# Altium footprint library 20210518.PcbLib: 414 footprints (part 15 of 26)
Each footprint in its own frame and in the unit in brackets; x right, y up, seen from the top. Pads: shape width x height; smd on the part's side, far side on the other; paste and mask are expansions set on the pad; w line width, h text height; cw(c..) or ccw(c..) is an arc to the next point about the centre after c.
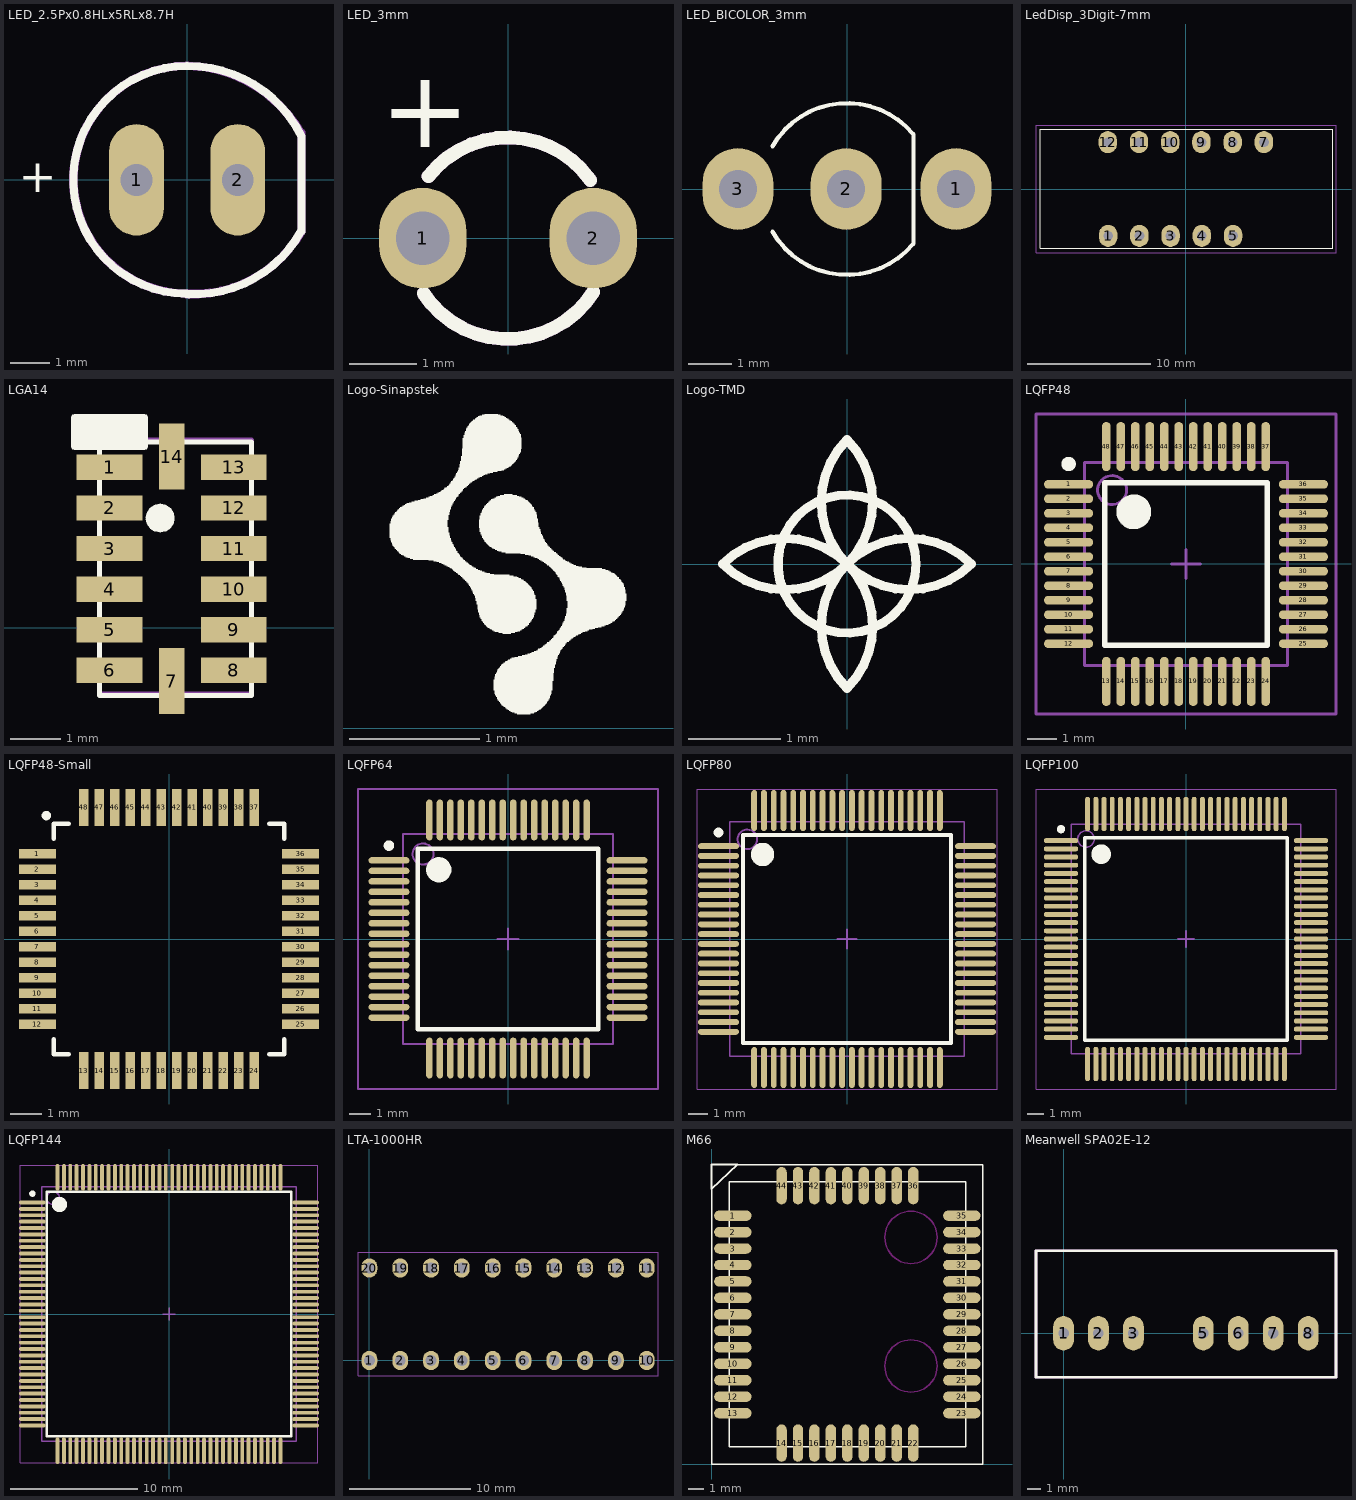
[diagram p14: the footprints below, top view; thin cyan lines are the x and y axes]

## LED_2.5Px0.8HLx5RLx8.7H [mil] "Radial, Round with Domed Top,  2 Position, 2.5mm pin space, 0.8mm hole, Body 5mm Radius, Height 8.7mm"
height 342.52
pads (2):
  oval 54x110 hole 31.5: 1(-50,0) 2(50,0)
Top Overlay:
  lines w7.99: 1.61,-113.03 ccw(c6.35,8.48) 112.6,-50.67
  lines w8: -0.49,-112.5 cw(c0,0) 0,112.5 cw(c0.5,-13.28) 112.99,43 113,-51.02
  text "+" at -166.06,-23.35 h56.25
Mechanical 13:
  lines w8: -112.5,0 cw(c0,0) 0,112.5 cw(c-2.2,-19.9) 113.01,45.39 113,-51 cw(c6.15,10.77) 0,-112.5 cw(c0,0) -112.5,0
Mechanical 15:
  lines w8: -0.59,-112.99 ccw(c5.56,10.27) 112.41,-51.49 ; -0.59,112.68 cw(c-2.79,-19.72) 112.41,45.56 ; 0.41,-112.22 cw(c0.41,0.28) -112.09,0.28 cw(c0.41,0.28) 0.41,112.78 ; 112.83,-49.77 112.83,46.61
3D body: height 346.72, standoff -235.72, extent -114.58,-118.12 98.81,118.87

## LED_3mm [mm]
height 8.7
pads (2):
  oval 1.3x1.5 hole 0.8: 1(-1.27,0) 2(1.27,0)
Top Overlay:
  lines w0.203: -1.256,-0.82 ccw(c0,0) 1.269,-0.8 ; -1.182,0.923 cw(c0,0) 1.225,0.865
  text "+" at -1.905,0.965 h2
Mechanical 13:
  lines w0.203: -1.256,-0.82 ccw(c0,0) 1.269,-0.8 ; -1.182,0.923 cw(c0,0) 1.225,0.865
Mechanical 15:
  lines w0.203: -1.256,-0.82 ccw(c0,0) 1.269,-0.8 ; -1.182,0.923 cw(c0,0) 1.225,0.865
3D body: height 5.5, standoff -3, extent -1.9,-1.9 1.6,1.9

## LED_BICOLOR_3mm [mil]
pads (3):
  oval 65x75 hole 35: 1(100,0) 2(-0.79,0) 3(-100,0)
Top Overlay:
  lines w3.94: -68.37,-39.07 ccw(c0,0) 60.49,-50.41 ; -68.37,39.07 cw(c0,0) 60.49,50.41 ; 61.02,-50.2 61.02,50.2
3D body: height 274.6, standoff -106.3, extent -107.88,-74.8 107.88,74.8

## LedDisp_3Digit-7mm [mm]
height 8.7
pads (11):
  oval 1.5x1.8 hole 0.8: 1(-6.32,-3.81) 2(-3.78,-3.81) 3(-1.24,-3.81) 4(1.3,-3.81) 5(3.84,-3.81) 7(6.35,3.81) 8(3.81,3.81) 9(1.27,3.81) 10(-1.27,3.81) 11(-3.81,3.81) 12(-6.35,3.81)
Top Overlay:
  lines w0.1: -11.862,-4.801 -11.862,4.851 11.938,4.851 11.938,-4.801 -11.862,-4.801
Mechanical 15:
  lines w0.1: -12.192,-5.207 12.217,-5.207 12.217,5.207 -12.192,5.207 -12.192,-5.207
3D body: height 5.81, standoff -3.5, extent -12,-5.01 12,5

## LGA14 [mm]
pads (14):
  rect 1.3x0.5 smd: 1(-5.004,3.164) 2(-5.004,2.364) 3(-5.004,1.564) 4(-5.004,0.764) 5(-5.004,-0.036) 6(-5.004,-0.836) 8(-2.554,-0.836) 9(-2.554,-0.036) 10(-2.554,0.764) 11(-2.554,1.564) 12(-2.554,2.364) 13(-2.554,3.164)
  rect 0.5x1.3 smd: 7(-3.779,-1.049) 14(-3.779,3.377)
Top Overlay:
  region: -3.907,2.428 -3.898,2.422 -3.888,2.42 -3.814,2.371 -3.808,2.362 -3.799,2.356 -3.75,2.282 -3.747,2.272 -3.741,2.263 -3.724,2.175 -3.726,2.165 -3.724,2.154 -3.741,2.067 -3.747,2.058 -3.75,2.048 -3.759,2.034 -3.76,2.033 -3.761,2.031 -3.799,1.974 -3.808,1.968 -3.814,1.959 -3.888,1.91 -3.898,1.907 -3.907,1.901 -3.994,1.884 -4.005,1.886 -4.015,1.884 -4.103,1.901 -4.112,1.907 -4.122,1.91 -4.196,1.959 -4.202,1.968 -4.211,1.974 -4.26,2.048 -4.262,2.058 -4.268,2.067 -4.286,2.154 -4.284,2.165 -4.286,2.175 -4.268,2.263 -4.262,2.272 -4.26,2.282 -4.211,2.356 -4.202,2.362 -4.196,2.371 -4.122,2.42 -4.112,2.422 -4.103,2.428 -4.015,2.446 -4.005,2.444 -3.994,2.446
  region: -4.266,4.201 -4.251,4.163 -4.251,3.564 -4.266,3.525 -4.305,3.51 -5.703,3.51 -5.742,3.525 -5.757,3.564 -5.757,4.163 -5.742,4.201 -5.703,4.217 -4.305,4.217
  lines w0.1: -5.204,-1.332 -5.204,3.664 -3.306,3.664 -2.207,3.664 -2.207,-1.332 -5.204,-1.332
Mechanical 13:
  lines w0.1: -5.2,3.7 -5.2,-1.3 -2.2,-1.3 -2.2,3.7 -5.1,3.7
Mechanical 15:
  lines w0.1: -5.2,-1.3 -2.2,-1.3 -2.2,3.7 -5.2,3.7 -5.2,-1.3
3D body: height 0, standoff -1.43, extent -5.3,-1.3 -2.3,3.7

## Logo-Sinapstek [mm]
Top Overlay:
  drawing of 2 lines, arcs and shapes, not listed

## Logo-TMD [mm]
Top Overlay:
  circle w0.1: c0,0 r0.75
  lines w0.1: 0,0 ccw(c0.675,0.675) 1.35,0 ccw(c0.675,-0.675) 0,0 ; 0,0 ccw(c0.675,-0.675) 0,-1.35 ccw(c-0.675,-0.675) 0,0 ; 0,0 ccw(c-0.675,-0.675) -1.35,0 ccw(c-0.675,0.675) 0,0 ; 0,0 cw(c0.675,0.675) 0,1.35 cw(c-0.675,0.675) 0,0

## LQFP48 [mm] "LQFP, 48-Leads, Body 9,1x9,1mm (max), Pitch 0,50mm, IPC Medium Density"
height 0.2
pads (48):
  oval 1.7x0.3 smd: 1(-4.05,2.75) 2(-4.05,2.25) 3(-4.05,1.75) 4(-4.05,1.25) 5(-4.05,0.75) 6(-4.05,0.25) 7(-4.05,-0.25) 8(-4.05,-0.75) 9(-4.05,-1.25) 10(-4.05,-1.75) 11(-4.05,-2.25) 12(-4.05,-2.75) 25(4.05,-2.75) 26(4.05,-2.25) 27(4.05,-1.75) 28(4.05,-1.25) 29(4.05,-0.75) 30(4.05,-0.25) 31(4.05,0.25) 32(4.05,0.75) 33(4.05,1.25) 34(4.05,1.75) 35(4.05,2.25) 36(4.05,2.75)
  oval 0.3x1.7 smd: 13(-2.75,-4.05) 14(-2.25,-4.05) 15(-1.75,-4.05) 16(-1.25,-4.05) 17(-0.75,-4.05) 18(-0.25,-4.05) 19(0.25,-4.05) 20(0.75,-4.05) 21(1.25,-4.05) 22(1.75,-4.05) 23(2.25,-4.05) 24(2.75,-4.05) 37(2.75,4.05) 38(2.25,4.05) 39(1.75,4.05) 40(1.25,4.05) 41(0.75,4.05) 42(0.25,4.05) 43(-0.25,4.05) 44(-0.75,4.05) 45(-1.25,4.05) 46(-1.75,4.05) 47(-2.25,4.05) 48(-2.75,4.05)
Top Overlay:
  circle w0.25: c-4.05,3.45 r0.125
  circle w0.6: c-1.8,1.8 r0.3
  lines w0.2: -2.8,-2.8 -2.8,2.8 2.8,2.8 2.8,-2.8 -2.8,-2.8
Mechanical 13:
  circle w0.1: c-2.55,2.55 r0.5
  lines w0.1: -3.5,-3.5 -3.5,3.5 3.5,3.5 3.5,-3.5 -3.5,-3.5
Mechanical 15:
  lines w0.1: -0.5,0 0.5,0 ; 0,-0.5 0,0.5 ; -5.175,-5.175 -5.175,5.175 5.175,5.175 5.175,-5.175 -5.175,-5.175
3D body: height 1.45, standoff 0, extent -4.5,-4.5 4.5,4.5

## LQFP48-Small [mm]
pads (48):
  rect 1.194x0.305 smd: 1(-4.25,2.75) 2(-4.25,2.25) 3(-4.25,1.75) 4(-4.25,1.25) 5(-4.25,0.75) 6(-4.25,0.25) 7(-4.25,-0.25) 8(-4.25,-0.75) 9(-4.25,-1.25) 10(-4.25,-1.75) 11(-4.25,-2.25) 12(-4.25,-2.75) 25(4.25,-2.75) 26(4.25,-2.25) 27(4.25,-1.75) 28(4.25,-1.25) 29(4.25,-0.75) 30(4.25,-0.25) 31(4.25,0.25) 32(4.25,0.75) 33(4.25,1.25) 34(4.25,1.75) 35(4.25,2.25) 36(4.25,2.75)
  rect 0.305x1.194 smd: 13(-2.75,-4.25) 14(-2.25,-4.25) 15(-1.75,-4.25) 16(-1.25,-4.25) 17(-0.75,-4.25) 18(-0.25,-4.25) 19(0.25,-4.25) 20(0.75,-4.25) 21(1.25,-4.25) 22(1.75,-4.25) 23(2.25,-4.25) 24(2.75,-4.25) 37(2.75,4.25) 38(2.25,4.25) 39(1.75,4.25) 40(1.25,4.25) 41(0.75,4.25) 42(0.25,4.25) 43(-0.25,4.25) 44(-0.75,4.25) 45(-1.25,4.25) 46(-1.75,4.25) 47(-2.25,4.25) 48(-2.75,4.25)
Top Overlay:
  circle w0.152: c-3.962,3.988 r0.076
  lines w0.152: -3.721,-3.235 -3.721,-3.721 -3.235,-3.721 ; -3.721,3.235 -3.721,3.721 -3.235,3.721 ; 3.235,-3.721 3.721,-3.721 3.721,-3.235 ; 3.235,3.721 3.721,3.721 3.721,3.235
3D body: height 1.6, standoff 0, extent -4.498,-4.497 4.496,4.497

## LQFP64 [mm] "LQFP, 64-Leads, Body 12,2x12,2mm (max), Pitch 0,50mm, IPC Low Density"
height 1.7
pads (64):
  oval 1.95x0.3 smd: 1(-5.675,3.75) 2(-5.675,3.25) 3(-5.675,2.75) 4(-5.675,2.25) 5(-5.675,1.75) 6(-5.675,1.25) 7(-5.675,0.75) 8(-5.675,0.25) 9(-5.675,-0.25) 10(-5.675,-0.75) 11(-5.675,-1.25) 12(-5.675,-1.75) 13(-5.675,-2.25) 14(-5.675,-2.75) 15(-5.675,-3.25) 16(-5.675,-3.75) 33(5.675,-3.75) 34(5.675,-3.25) 35(5.675,-2.75) 36(5.675,-2.25) 37(5.675,-1.75) 38(5.675,-1.25) 39(5.675,-0.75) 40(5.675,-0.25) 41(5.675,0.25) 42(5.675,0.75) 43(5.675,1.25) 44(5.675,1.75) 45(5.675,2.25) 46(5.675,2.75) 47(5.675,3.25) 48(5.675,3.75)
  oval 0.3x1.95 smd: 17(-3.75,-5.675) 18(-3.25,-5.675) 19(-2.75,-5.675) 20(-2.25,-5.675) 21(-1.75,-5.675) 22(-1.25,-5.675) 23(-0.75,-5.675) 24(-0.25,-5.675) 25(0.25,-5.675) 26(0.75,-5.675) 27(1.25,-5.675) 28(1.75,-5.675) 29(2.25,-5.675) 30(2.75,-5.675) 31(3.25,-5.675) 32(3.75,-5.675) 49(3.75,5.675) 50(3.25,5.675) 51(2.75,5.675) 52(2.25,5.675) 53(1.75,5.675) 54(1.25,5.675) 55(0.75,5.675) 56(0.25,5.675) 57(-0.25,5.675) 58(-0.75,5.675) 59(-1.25,5.675) 60(-1.75,5.675) 61(-2.25,5.675) 62(-2.75,5.675) 63(-3.25,5.675) 64(-3.75,5.675)
Top Overlay:
  circle w0.25: c-5.675,4.45 r0.125
  circle w0.6: c-3.3,3.3 r0.3
  lines w0.2: -4.3,-4.3 -4.3,4.3 4.3,4.3 4.3,-4.3 -4.3,-4.3
Mechanical 13:
  circle w0.1: c-4.05,4.05 r0.5
  lines w0.1: -5,-5 -5,5 5,5 5,-5 -5,-5
Mechanical 15:
  lines w0.1: -0.5,0 0.5,0 ; 0,-0.5 0,0.5 ; -7.15,-7.15 -7.15,7.15 7.15,7.15 7.15,-7.15 -7.15,-7.15
3D body: height 1.6, standoff 0, extent -6,-6 6,6

## LQFP80 [mm] "LQFP, 80-Leads, Body 12,00x12,00mm, Pitch 0,50mm, IPC Medium Density"
height 1.6
pads (80):
  oval 2.1x0.3 smd: 1(-6.575,4.75) 2(-6.575,4.25) 3(-6.575,3.75) 4(-6.575,3.25) 5(-6.575,2.75) 6(-6.575,2.25) 7(-6.575,1.75) 8(-6.575,1.25) 9(-6.575,0.75) 10(-6.575,0.25) 11(-6.575,-0.25) 12(-6.575,-0.75) 13(-6.575,-1.25) 14(-6.575,-1.75) 15(-6.575,-2.25) 16(-6.575,-2.75) 17(-6.575,-3.25) 18(-6.575,-3.75) 19(-6.575,-4.25) 20(-6.575,-4.75) 41(6.575,-4.75) 42(6.575,-4.25) 43(6.575,-3.75) 44(6.575,-3.25) 45(6.575,-2.75) 46(6.575,-2.25) 47(6.575,-1.75) 48(6.575,-1.25) 49(6.575,-0.75) 50(6.575,-0.25) 51(6.575,0.25) 52(6.575,0.75) 53(6.575,1.25) 54(6.575,1.75) 55(6.575,2.25) 56(6.575,2.75) 57(6.575,3.25) 58(6.575,3.75) 59(6.575,4.25) 60(6.575,4.75)
  oval 0.3x2.1 smd: 21(-4.75,-6.575) 22(-4.25,-6.575) 23(-3.75,-6.575) 24(-3.25,-6.575) 25(-2.75,-6.575) 26(-2.25,-6.575) 27(-1.75,-6.575) 28(-1.25,-6.575) 29(-0.75,-6.575) 30(-0.25,-6.575) 31(0.25,-6.575) 32(0.75,-6.575) 33(1.25,-6.575) 34(1.75,-6.575) 35(2.25,-6.575) 36(2.75,-6.575) 37(3.25,-6.575) 38(3.75,-6.575) 39(4.25,-6.575) 40(4.75,-6.575) 61(4.75,6.575) 62(4.25,6.575) 63(3.75,6.575) 64(3.25,6.575) 65(2.75,6.575) 66(2.25,6.575) 67(1.75,6.575) 68(1.25,6.575) 69(0.75,6.575) 70(0.25,6.575) 71(-0.25,6.575) 72(-0.75,6.575) 73(-1.25,6.575) 74(-1.75,6.575) 75(-2.25,6.575) 76(-2.75,6.575) 77(-3.25,6.575) 78(-3.75,6.575) 79(-4.25,6.575) 80(-4.75,6.575)
Top Overlay:
  circle w0.6: c-4.325,4.325 r0.3
  circle w0.25: c-6.575,5.45 r0.125
  lines w0.2: -5.325,-5.325 5.325,-5.325 5.325,5.325 -5.325,5.325 -5.325,-5.325
Mechanical 13:
  circle w0.1: c-5.1,5.1 r0.5
  lines w0.1: -6,-6 6,-6 6,6 -6,6 -6,-6
Mechanical 15:
  lines w0.05: -7.675,-7.675 7.675,-7.675 7.675,7.675 -7.675,7.675 -7.675,-7.675
  lines w0.1: -0.5,0 0.5,0 ; 0,-0.5 0,0.5
3D body: height 1.62, standoff -0.01, extent -7.072,-7.072 7.072,7.072

## LQFP100 [mm] "LQFP, 100-Leads, Body 14,00x14,00mm, Pitch 0,50mm, IPC Low Density"
height 1.6
pads (100):
  oval 2.1x0.3 smd: 1(-7.625,6) 2(-7.625,5.5) 3(-7.625,5) 4(-7.625,4.5) 5(-7.625,4) 6(-7.625,3.5) 7(-7.625,3) 8(-7.625,2.5) 9(-7.625,2) 10(-7.625,1.5) 11(-7.625,1) 12(-7.625,0.5) 13(-7.625,0) 14(-7.625,-0.5) 15(-7.625,-1) 16(-7.625,-1.5) 17(-7.625,-2) 18(-7.625,-2.5) 19(-7.625,-3) 20(-7.625,-3.5) 21(-7.625,-4) 22(-7.625,-4.5) 23(-7.625,-5) 24(-7.625,-5.5) 25(-7.625,-6) 51(7.625,-6) 52(7.625,-5.5) 53(7.625,-5) 54(7.625,-4.5) 55(7.625,-4) 56(7.625,-3.5) 57(7.625,-3) 58(7.625,-2.5) 59(7.625,-2) 60(7.625,-1.5) 61(7.625,-1) 62(7.625,-0.5) 63(7.625,0) 64(7.625,0.5) 65(7.625,1) 66(7.625,1.5) 67(7.625,2) 68(7.625,2.5) 69(7.625,3) 70(7.625,3.5) 71(7.625,4) 72(7.625,4.5) 73(7.625,5) 74(7.625,5.5) 75(7.625,6)
  oval 0.3x2.1 smd: 26(-6,-7.625) 27(-5.5,-7.625) 28(-5,-7.625) 29(-4.5,-7.625) 30(-4,-7.625) 31(-3.5,-7.625) 32(-3,-7.625) 33(-2.5,-7.625) 34(-2,-7.625) 35(-1.5,-7.625) 36(-1,-7.625) 37(-0.5,-7.625) 38(0,-7.625) 39(0.5,-7.625) 40(1,-7.625) 41(1.5,-7.625) 42(2,-7.625) 43(2.5,-7.625) 44(3,-7.625) 45(3.5,-7.625) 46(4,-7.625) 47(4.5,-7.625) 48(5,-7.625) 49(5.5,-7.625) 50(6,-7.625) 76(6,7.625) 77(5.5,7.625) 78(5,7.625) 79(4.5,7.625) 80(4,7.625) 81(3.5,7.625) 82(3,7.625) 83(2.5,7.625) 84(2,7.625) 85(1.5,7.625) 86(1,7.625) 87(0.5,7.625) 88(0,7.625) 89(-0.5,7.625) 90(-1,7.625) 91(-1.5,7.625) 92(-2,7.625) 93(-2.5,7.625) 94(-3,7.625) 95(-3.5,7.625) 96(-4,7.625) 97(-4.5,7.625) 98(-5,7.625) 99(-5.5,7.625) 100(-6,7.625)
Top Overlay:
  circle w0.6: c-5.175,5.175 r0.3
  circle w0.25: c-7.625,6.7 r0.125
  lines w0.2: -6.175,-6.175 6.175,-6.175 6.175,6.175 -6.175,6.175 -6.175,-6.175
Mechanical 13:
  circle w0.1: c-6.1,6.1 r0.5
  lines w0.1: -7,-7 7,-7 7,7 -7,7 -7,-7
Mechanical 15:
  lines w0.05: -9.15,-9.15 9.15,-9.15 9.15,9.15 -9.15,9.15 -9.15,-9.15
  lines w0.1: -0.5,0 0.5,0 ; 0,-0.5 0,0.5
3D body: height 1.6, standoff 0, extent -8,-8 8,8

## LQFP144 [mm] "TSQFP, 144-Leads, Body 20,00x20,00mm, Pitch 0,50mm, IPC Medium Density"
height 1.6
pads (144):
  oval 2.1x0.3 smd: 1(-10.725,8.75) 2(-10.725,8.25) 3(-10.725,7.75) 4(-10.725,7.25) 5(-10.725,6.75) 6(-10.725,6.25) 7(-10.725,5.75) 8(-10.725,5.25) 9(-10.725,4.75) 10(-10.725,4.25) 11(-10.725,3.75) 12(-10.725,3.25) 13(-10.725,2.75) 14(-10.725,2.25) 15(-10.725,1.75) 16(-10.725,1.25) 17(-10.725,0.75) 18(-10.725,0.25) 19(-10.725,-0.25) 20(-10.725,-0.75) 21(-10.725,-1.25) 22(-10.725,-1.75) 23(-10.725,-2.25) 24(-10.725,-2.75) 25(-10.725,-3.25) 26(-10.725,-3.75) 27(-10.725,-4.25) 28(-10.725,-4.75) 29(-10.725,-5.25) 30(-10.725,-5.75) 31(-10.725,-6.25) 32(-10.725,-6.75) 33(-10.725,-7.25) 34(-10.725,-7.75) 35(-10.725,-8.25) 36(-10.725,-8.75) 73(10.725,-8.75) 74(10.725,-8.25) 75(10.725,-7.75) 76(10.725,-7.25) 77(10.725,-6.75) 78(10.725,-6.25) 79(10.725,-5.75) 80(10.725,-5.25) 81(10.725,-4.75) 82(10.725,-4.25) 83(10.725,-3.75) 84(10.725,-3.25) 85(10.725,-2.75) 86(10.725,-2.25) 87(10.725,-1.75) 88(10.725,-1.25) 89(10.725,-0.75) 90(10.725,-0.25) 91(10.725,0.25) 92(10.725,0.75) 93(10.725,1.25) 94(10.725,1.75) 95(10.725,2.25) 96(10.725,2.75) 97(10.725,3.25) 98(10.725,3.75) 99(10.725,4.25) 100(10.725,4.75) 101(10.725,5.25) 102(10.725,5.75) 103(10.725,6.25) 104(10.725,6.75) 105(10.725,7.25) 106(10.725,7.75) 107(10.725,8.25) 108(10.725,8.75)
  oval 0.3x2.1 smd: 37(-8.75,-10.725) 38(-8.25,-10.725) 39(-7.75,-10.725) 40(-7.25,-10.725) 41(-6.75,-10.725) 42(-6.25,-10.725) 43(-5.75,-10.725) 44(-5.25,-10.725) 45(-4.75,-10.725) 46(-4.25,-10.725) 47(-3.75,-10.725) 48(-3.25,-10.725) 49(-2.75,-10.725) 50(-2.25,-10.725) 51(-1.75,-10.725) 52(-1.25,-10.725) 53(-0.75,-10.725) 54(-0.25,-10.725) 55(0.25,-10.725) 56(0.75,-10.725) 57(1.25,-10.725) 58(1.75,-10.725) 59(2.25,-10.725) 60(2.75,-10.725) 61(3.25,-10.725) 62(3.75,-10.725) 63(4.25,-10.725) 64(4.75,-10.725) 65(5.25,-10.725) 66(5.75,-10.725) 67(6.25,-10.725) 68(6.75,-10.725) 69(7.25,-10.725) 70(7.75,-10.725) 71(8.25,-10.725) 72(8.75,-10.725) 109(8.75,10.725) 110(8.25,10.725) 111(7.75,10.725) 112(7.25,10.725) 113(6.75,10.725) 114(6.25,10.725) 115(5.75,10.725) 116(5.25,10.725) 117(4.75,10.725) 118(4.25,10.725) 119(3.75,10.725) 120(3.25,10.725) 121(2.75,10.725) 122(2.25,10.725) 123(1.75,10.725) 124(1.25,10.725) 125(0.75,10.725) 126(0.25,10.725) 127(-0.25,10.725) 128(-0.75,10.725) 129(-1.25,10.725) 130(-1.75,10.725) 131(-2.25,10.725) 132(-2.75,10.725) 133(-3.25,10.725) 134(-3.75,10.725) 135(-4.25,10.725) 136(-4.75,10.725) 137(-5.25,10.725) 138(-5.75,10.725) 139(-6.25,10.725) 140(-6.75,10.725) 141(-7.25,10.725) 142(-7.75,10.725) 143(-8.25,10.725) 144(-8.75,10.725)
Top Overlay:
  circle w0.6: c-8.6,8.6 r0.3
  circle w0.25: c-10.725,9.45 r0.125
  lines w0.2: -9.6,-9.6 9.6,-9.6 9.6,9.6 -9.6,9.6 -9.6,-9.6
Mechanical 13:
  circle w0.1: c-9.1,9.1 r0.5
  lines w0.1: -10,-10 10,-10 10,10 -10,10 -10,-10
Mechanical 15:
  lines w0.05: -11.675,-11.675 11.675,-11.675 11.675,11.675 -11.675,11.675 -11.675,-11.675
  lines w0.1: -0.5,0 0.5,0 ; 0,-0.5 0,0.5
3D body: height 1.6, standoff 0, extent -11.075,-11.075 11.075,11.075

## LTA-1000HR [mm] "10 Wide, DIP Red (x 10) Tinted"
height 8
pads (20):
  oval 1.3x1.6 hole 0.9: 1(0,0) 2(2.54,0) 3(5.08,0) 4(7.62,0) 5(10.16,0) 6(12.7,0) 7(15.24,0) 8(17.78,0) 9(20.32,0) 10(22.86,0) 11(22.86,7.62) 12(20.32,7.62) 13(17.78,7.62) 14(15.24,7.62) 15(12.7,7.62) 16(10.16,7.62) 17(7.62,7.62) 18(5.08,7.62) 19(2.54,7.62) 20(0,7.62)
Bottom Overlay:
  lines w0.1: 10.16,5.83 12.36,5.83 ; 10.29,2.32 12.29,2.32 ; 11.29,1.32 11.29,3.32
  text "1" at -0.1,1.1 h0.5
Mechanical 15:
  lines w0.1: -0.94,-1.25 -0.94,8.91 23.79,8.91 23.79,-1.25 -0.94,-1.25

## M66 [mm]
pads (44):
  oval 2.5x0.7 smd: 1(1.4,16.6) 2(1.4,15.5) 3(1.4,14.4) 4(1.4,13.3) 5(1.4,12.2) 6(1.4,11.1) 7(1.4,10) 8(1.4,8.9) 9(1.4,7.8) 10(1.4,6.7) 11(1.4,5.6) 12(1.4,4.5) 13(1.4,3.4) 23(16.7,3.4) 24(16.7,4.5) 25(16.7,5.6) 26(16.7,6.7) 27(16.7,7.8) 28(16.7,8.9) 29(16.7,10) 30(16.7,11.1) 31(16.7,12.2) 32(16.7,13.3) 33(16.7,14.4) 34(16.7,15.5) 35(16.7,16.6)
  oval 0.7x2.5 smd: 14(4.65,1.4) 15(5.75,1.4) 16(6.85,1.4) 17(7.95,1.4) 18(9.05,1.4) 19(10.15,1.4) 20(11.25,1.4) 21(12.35,1.4) 22(13.45,1.4) 36(13.45,18.6) 37(12.35,18.6) 38(11.25,18.6) 39(10.15,18.6) 40(9.05,18.6) 41(7.95,18.6) 42(6.85,18.6) 43(5.75,18.6) 44(4.65,18.6)
Top Overlay:
  lines w0.1: -0.05,18.352 -0.05,20.05 1.711,20.05 -0.05,18.352 ; 0,0 0,20 18.1,20 18.1,0 0,0 ; 1.15,1.15 1.15,18.85 16.95,18.85 16.95,1.15 1.15,1.15
Keep-Out Layer:
  circle w0.1: c13.3,15.15 r1.75
  circle w0.1: c13.3,6.55 r1.75
3D body: height 2.3, standoff 0, extent 1.12,1.15 16.92,18.85

## Meanwell SPA02E-12 [mm] "MEanwell SPA02E-12 12V Dc-Dc Converter"
pads (7):
  oval 1.5x2.5 hole 0.762: 1(0,0) 2(2.54,0) 3(5.08,0) 5(10.16,0) 6(12.7,0) 7(15.24,0) 8(17.78,0)
Top Overlay:
  lines w0.2: -2,-3.2 -2,6 19.8,6 19.8,-3.2 -2,-3.2
Mechanical 13:
  lines w0.2: -2,-3.2 -2,6 19.8,6 19.8,-3.2 -2,-3.2
Mechanical 15:
  lines w0.2: -2,-3.2 -2,6 19.8,6 19.8,-3.2 -2,-3.2
3D body: height 11.1, standoff 0, extent -2,-3.2 19.8,6